# Altium footprint library ATROTECH.PcbLib: 334 footprints (part 3 of 21)
Each footprint in its own frame and in the unit in brackets; x right, y up, seen from the top. Pads: shape width x height; smd on the part's side, far side on the other; paste and mask are expansions set on the pad; w line width, h text height; cw(c..) or ccw(c..) is an arc to the next point about the centre after c.
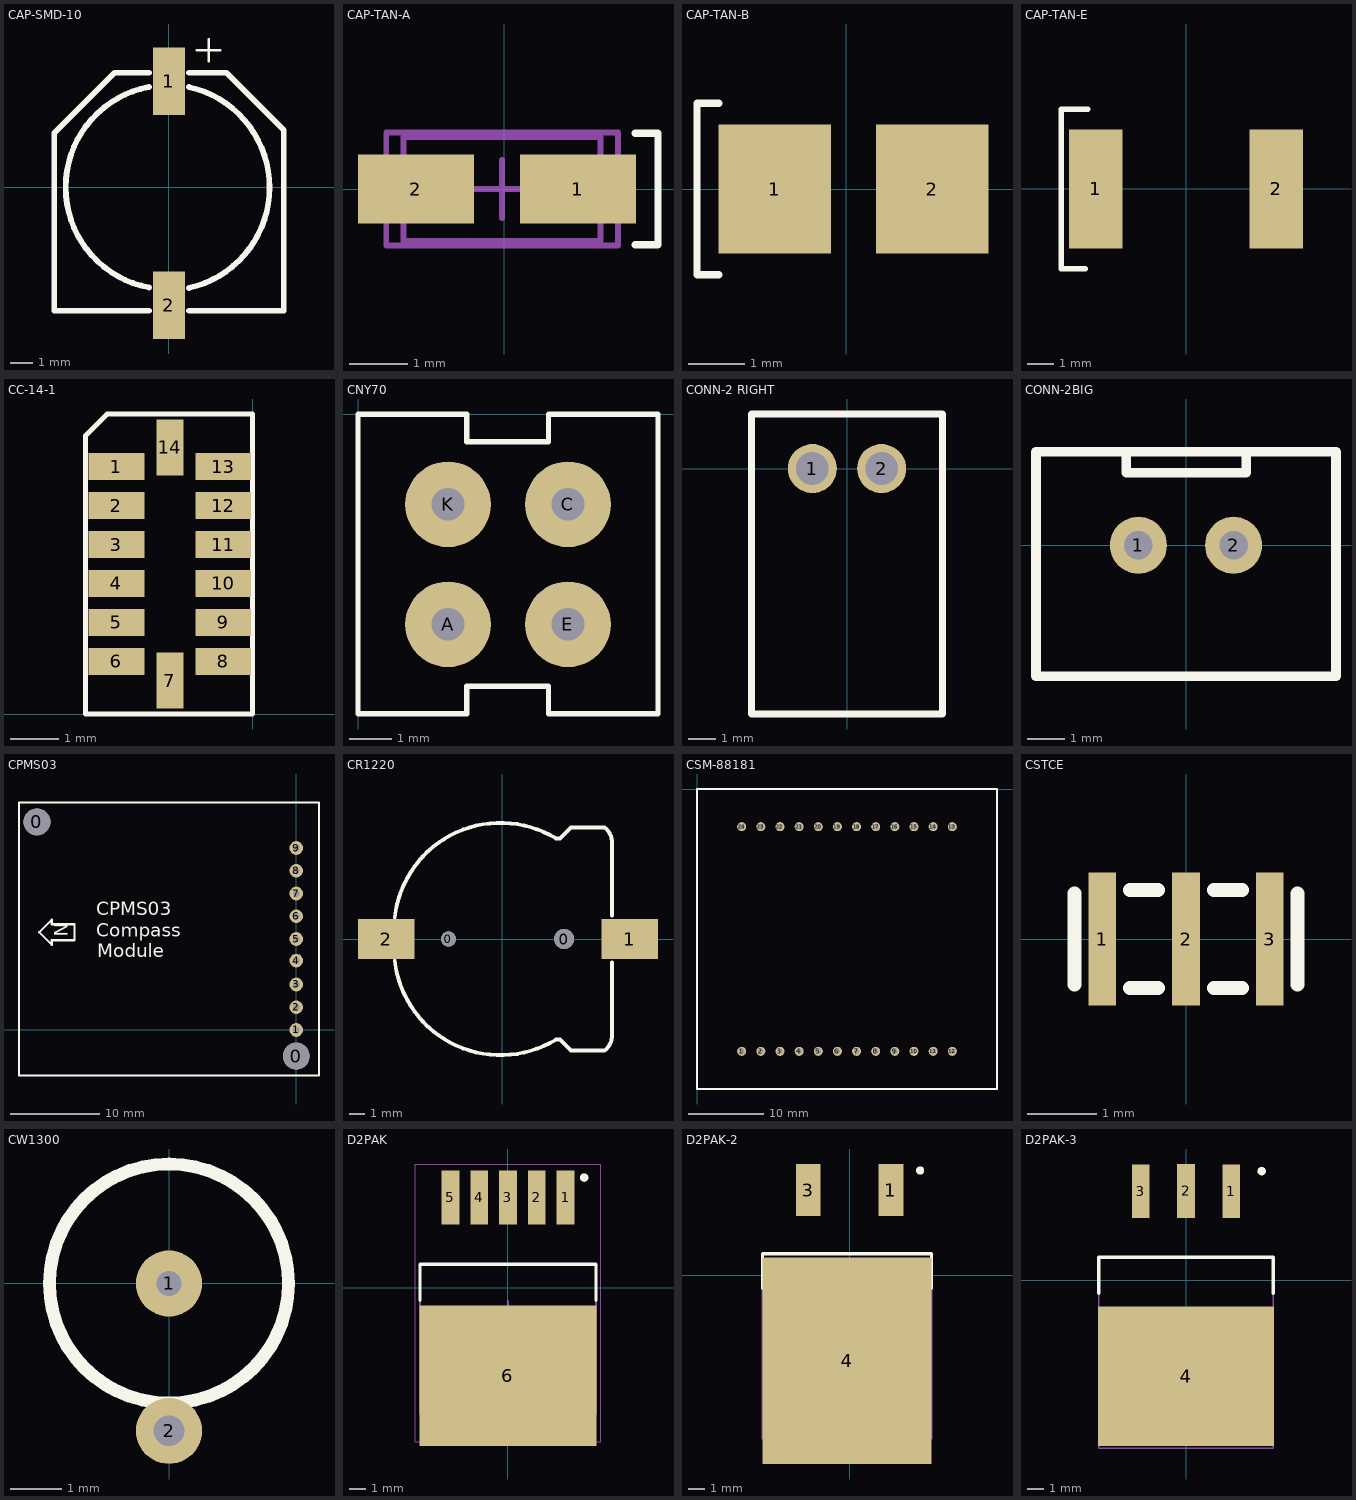
[diagram p2: the footprints below, top view; thin cyan lines are the x and y axes]

## CAP-SMD-10 [mil]
pads (2):
  rect 55x118 smd: 1(0,185) 2(0,-205)
Top Overlay:
  lines w3.94: 48.39,239.02 89.72,239.02 ; 69.06,219.33 69.06,258.7
  lines w10: -35,-215 -200,-215 -200,95 -95,200 -35,200 ; -35,175 ccw(c-2.51,0.43) -34.85,-174.17 ; 35,-215 200,-215 200,100 100,200 35,200 ; 35,-175 ccw(c-4.02,0) 35,175
3D body "NICHICON_UWT1H221MNL1GS.STEP": height 401.63, standoff 0, extent -200.52,-224.14 204.99,204.99

## CAP-TAN-A [mm] "Chip Capacitor, 2-Leads, Body 3.2x1.6mm, IPC High Density, chip Tantalum"
height 1.8
pads (2):
  rect 1.999x1.199 smd: 1(1.27,0) 2(-1.53,0)
Top Overlay:
  lines w0.127: 2.258,-0.965 2.652,-0.965 2.652,0.965 2.258,0.965
Mechanical 13:
  lines w0.1: -1.741,-0.9 1.659,-0.9 1.659,0.9 -1.741,0.9 -1.741,-0.9
Mechanical 15:
  lines w0.1: -0.541,0 0.459,0 ; -0.041,-0.5 -0.041,0.5 ; -2.041,-0.975 -2.041,0.975 1.959,0.975 1.959,-0.975 -2.041,-0.975
3D body "SW3dPS-Solid Tantalum Chip Capacitor Size (A-3216-18).STEP": height 1.8, standoff 0, extent -1.94,-0.902 1.699,0.902

## CAP-TAN-B [mm]
pads (2):
  rect 2x2.3 smd: 1(-1.27,0)
  rect 1.999x2.3 smd: 2(1.53,0)
Top Overlay:
  lines w0.127: -2.258,-1.524 -2.651,-1.524 -2.651,1.524 -2.258,1.524
3D body "User Library-AVX_BCASE.step": height 2.03, standoff 0, extent -1.85,-1.465 1.85,1.465

## CAP-TAN-E [mm]
pads (2):
  rect 2x4.5 smd: 1(-3.4,0) 2(3.4,0)
Top Overlay:
  lines w0.2: -3.8,-3 -4.7,-3 -4.7,3 -3.7,3
3D body "User Library-CaseE_7260-38.step": height 3.6, standoff 0, extent -3.65,-3 3.65,3

## CC-14-1 [mm]
height 1
pads (14):
  rect 1.145x0.55 smd: 1(-2.794,5.08) 2(-2.794,4.28) 3(-2.794,3.48) 4(-2.794,2.68) 5(-2.794,1.88) 6(-2.794,1.08) 8(-0.599,1.08) 9(-0.599,1.88) 10(-0.599,2.68) 11(-0.599,3.48) 12(-0.599,4.28) 13(-0.599,5.08)
  rect 0.55x1.145 smd: 7(-1.696,0.687) 14(-1.696,5.473)
Top Overlay:
  lines w0.1: -3.429,0 0,0 0,6.159 -2.984,6.159 -3.429,5.715 -3.429,0

## CNY70 [mm]
pads (4):
  round 2 hole 0.762: A(2.1,-4.9) C(4.9,-2.1) E(4.9,-4.9) K(2.1,-2.1)
Top Overlay:
  lines w0.127: 6.985,0 4.445,0 4.445,-0.635 2.54,-0.635 2.54,0 0,0 0,-6.985 2.54,-6.985 2.54,-6.35 4.445,-6.35 4.445,-6.985 7,-6.985 7,0
3D body "CNY70.STEP": height 6, standoff 0, extent -0.02,-6.96 6.98,0.04
3D body "pin 0.4x0.5.STEP": height 0, standoff -5, extent 1.884,-5.099 2.384,-4.699
3D body "pin 0.4x0.5.STEP": height 0, standoff -5, extent 4.68,-5.199 5.08,-4.699
3D body "pin 0.4x0.5.STEP": height 0, standoff -5, extent 1.88,-2.358 2.28,-1.858
3D body "pin 0.4x0.5.STEP": height 0, standoff -5, extent 4.702,-2.405 5.102,-1.905

## CONN-2 RIGHT [mm]
pads (2):
  round 1.8 hole 1.2: 1(-1.27,0) 2(1.27,0)
Top Overlay:
  lines w0.254: -3.5,-9 3.5,-9 3.5,2 -3.5,2 -3.5,-9
3D body "CONNECTOR RIGHT.STEP": height 5.5, standoff 0, extent -3.699,-9.119 3.801,2.881
3D body "pin right.STEP": height 3.9, standoff -2, extent 0.82,-8.468 1.72,0.432
3D body "pin right.STEP": height 3.9, standoff -2, extent -1.662,-8.519 -0.762,0.381

## CONN-2BIG [mil]
pads (2):
  round 60 hole 30: 1(-50,0) 2(50,0)
Top Overlay:
  lines w10: -62.5,98.43 -62.5,76.2 63.5,76.2 63.5,98.43 ; 157.46,-137.8 -157.5,-137.8 -157.5,98.43 157.46,98.43 ; 157.5,-137.8 157.5,98.43

## CPMS03 [mil]
pads (11):
  round 118.11 hole 118.11: 0(-1140,915) 0(0,-115)
  round 60 hole 30: 1(0,0) 2(0,100) 3(0,200) 4(0,305) 5(0,400) 6(0,500) 7(0,600) 8(0,700) 9(0,800)
Top Overlay:
  lines w10: -1218.9,-200 -1218.9,1000 100,1000 100,-200 -1218.9,-200 ; -1130,430 -1075,485 -1075,465 -975,465 -975,395 -1075,395 -1075,375 -1130,430
  text "Module" at -875,320 h60
  text "Compass" at -880,410 h60
  text "CPMS03" at -880,505 h60
  text "N" at -1005,410 h60

## CR1220 [mm]
pads (4):
  round 1 hole 1: 0(-3.5,0)
  round 1.3 hole 1.3: 0(4,0)
  rect 3.66x2.6 smd: 1(8.26,0) 2(-7.54,0)
Top Overlay:
  lines w0.254: -6.985,-1.397 ccw(c-0.127,-0.635) 3.465,-6.526 3.732,-6.526 4.45,-7.244 5.466,-7.244 6.608,-7.244 ccw(c5.842,-6.223) 7.112,-6.35 7.112,-1.524 ; -6.985,1.397 cw(c-0.127,0.635) 3.465,6.526 3.732,6.526 4.45,7.244 5.466,7.244 6.608,7.244 cw(c5.842,6.223) 7.112,6.35 7.112,1.524
3D body "BC501SM.STEP": height 4.2, standoff -0.88, extent -9.271,-7.493 9.271,7.493

## CSM-88181 [mm]
height 8.5
pads (24):
  round 1.2 hole 0.7: 1(5.93,-34.8) 2(8.47,-34.8) 3(11.01,-34.8) 4(13.55,-34.8) 5(16.09,-34.8) 6(18.63,-34.8) 7(21.17,-34.8) 8(23.71,-34.8) 9(26.25,-34.8) 10(28.79,-34.8) 11(31.33,-34.8) 12(33.87,-34.8) 13(33.87,-5) 14(31.33,-5) 15(28.79,-5) 16(26.25,-5) 17(23.71,-5) 18(21.17,-5) 19(18.63,-5) 20(16.09,-5) 21(13.55,-5) 22(11.01,-5) 23(8.47,-5) 24(5.93,-5)
Top Overlay:
  lines w0.2: 0,-39.8 0,0 39.8,0 39.8,-39.8 0,-39.8

## CSTCE [mm]
pads (3):
  rect 0.4x1.9 smd: 1(-1.2,0) 2(0,0) 3(1.2,0)
Top Overlay:
  lines w0.2: -1.6,-0.65 -1.6,0.65 ; -0.8,-0.7 -0.4,-0.7 ; -0.8,0.7 -0.4,0.7 ; 0.4,-0.7 0.8,-0.7 ; 0.4,0.7 0.8,0.7 ; 1.6,-0.65 1.6,0.65
3D body "User Library-CSTCE.step": height 0.7, standoff 0, extent -1.6,-0.65 1.6,0.65

## CW1300 [mm]
pads (2):
  round 1.3 hole 0.5: 1(0,0)
  round 1.3 hole 0.6: 2(0,-2.9)
Top Overlay:
  circle w0.254: c0,0 r2.35

## D2PAK [mm]
pads (6):
  rect 1.05x3.2 smd: 1(3.4,5.325) 2(1.7,5.325) 3(0,5.325) 4(-1.7,5.325) 5(-3.4,5.325)
  rect 10.45x8.3 smd: 6(0,-5.207)
Top Overlay:
  circle w0.25: c4.5,6.5 r0.125
  lines w0.2: -5.2,-0.762 -5.2,1.375 5.2,1.375 5.2,-0.762
Mechanical 13:
  lines w0.1: -5.2,-7.515 5.2,-7.515 5.2,1.375 -5.2,1.375 -5.2,-7.515
Mechanical 15:
  lines w0.05: -5.475,-9.125 5.475,-9.125 5.475,7.3 -5.475,7.3 -5.475,-9.125
  lines w0.1: -0.5,-1.275 0.5,-1.275 ; 0,-1.775 0,-0.775
3D body "TO263-5-1.stp": height 4.22, standoff 0, extent -4.911,-8.602 4.911,6

## D2PAK-2 [mm]
pads (3):
  rect 1.524x3.2 smd: 1(2.54,5.25) 3(-2.54,5.25)
  rect 10.414x12.7 smd: 4(-0.16,-5.25)
Top Overlay:
  circle w0.25: c4.34,6.45 r0.125
  lines w0.2: -5.36,-0.812 -5.36,1.325 5.04,1.325 5.04,-0.812
Mechanical 13:
  lines w0.1: -5.36,-10.05 5.04,-10.05 5.04,1.325 -5.36,1.325 -5.36,-10.05
3D body "User Library-D2PAK.step": height 4.83, standoff 0, extent -5.5,-9.78 5.17,6.1

## D2PAK-3 [mm] "TO-263  3-Lead Middle Pin Long"
pads (4):
  rect 1.05x3.2 smd: 1(2.7,5.3) 2(0,5.325) 3(-2.7,5.3)
  rect 10.45x8.3 smd: 4(0,-5.707)
Top Overlay:
  circle w0.25: c4.5,6.5 r0.125
  lines w0.2: -5.2,-0.762 -5.2,1.375 5.2,1.375 5.2,-0.762
Mechanical 13:
  lines w0.1: -5.2,-10 -5.2,1.375 5.2,1.375 5.2,-10 -5.2,-10
3D body "User Library-TO263-3-1.STEP": height 4.6, standoff -0.03, extent -5.2,-9.425 5.2,6.425